# Altium footprint library Molex FFC - FPC Connectors (SMT).PcbLib: 638 footprints (part 22 of 40)
Each footprint in its own frame and in the unit in brackets; x right, y up, seen from the top. Pads: shape width x height; smd on the part's side, far side on the other; paste and mask are expansions set on the pad; w line width, h text height; cw(c..) or ccw(c..) is an arc to the next point about the centre after c.
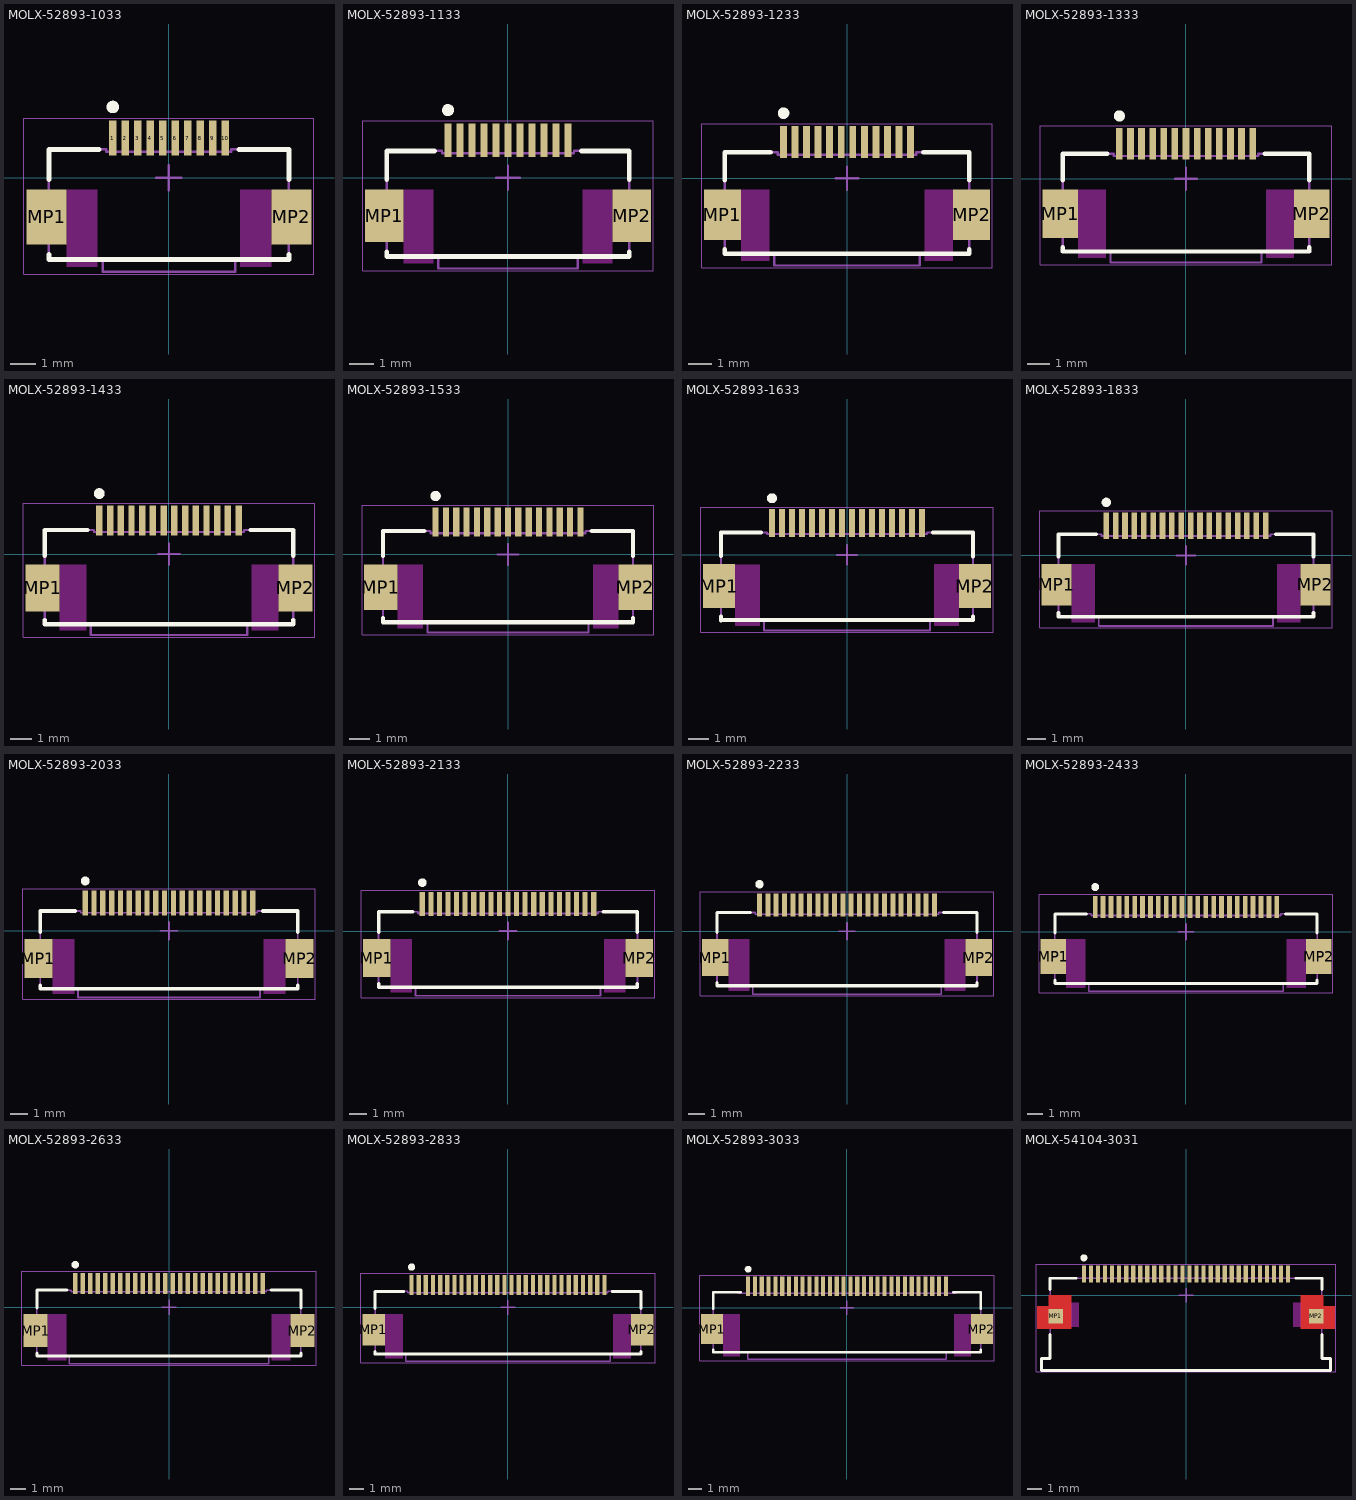
[diagram p21: the footprints below, top view; thin cyan lines are the x and y axes]

## MOLX-52893-1033 [mm] "FPC Connector, 10-Leads, Right Angle, Pitch 0.5 mm, Mated Height 2.0 mm, SMT"
height 2.082
pads (12):
  rect 0.3x1.4 smd: 1(-2.25,1.575) 2(-1.75,1.575) 3(-1.25,1.575) 4(-0.75,1.575) 5(-0.25,1.575) 6(0.25,1.575) 7(0.75,1.575) 8(1.25,1.575) 9(1.75,1.575) 10(2.25,1.575)
  rect 1.6x2.2 smd: MP1(-4.9,-1.575) MP2(4.9,-1.575)
Top Overlay:
  circle w0.25: c-2.25,2.825 r0.125
  lines w0.2: -4.8,-3.075 -4.8,-3.275 4.8,-3.275 4.8,-3.075 ; -4.8,-0.075 -4.8,1.125 -2.8,1.125 ; 2.8,1.125 4.8,1.125 4.8,-0.075
Keep-Out Layer:
  rectangle: 2.85,-3.575 4.1,-0.475
  rectangle: -4.1,-3.575 -2.85,-0.475
Mechanical 13:
  lines w0.1: -4.8,-3.275 -4.8,1.125 -2.5,1.125 -2.5,1.025 2.5,1.025 2.5,1.125 4.8,1.125 4.8,-3.275 2.65,-3.275 2.65,-3.762 -2.65,-3.762 -2.65,-3.275 -4.8,-3.275
Mechanical 15:
  lines w0.05: -5.8,-3.862 5.8,-3.862 5.8,2.375 -5.8,2.375 -5.8,-3.862
  lines w0.1: -0.5,0 0.5,0 ; 0,-0.5 0,0.5
3D body: height 0.25, standoff 0, extent -5.2,-3.775 5.2,1.725

## MOLX-52893-1133 [mm] "FPC Connector, 11-Leads, Right Angle, Pitch 0.5 mm, Mated Height 2.0 mm, SMT"
height 2.082
pads (13):
  rect 0.3x1.4 smd: 1(-2.5,1.575) 2(-2,1.575) 3(-1.5,1.575) 4(-1,1.575) 5(-0.5,1.575) 6(0,1.575) 7(0.5,1.575) 8(1,1.575) 9(1.5,1.575) 10(2,1.575) 11(2.5,1.575)
  rect 1.6x2.2 smd: MP1(-5.15,-1.575) MP2(5.15,-1.575)
Top Overlay:
  circle w0.25: c-2.5,2.825 r0.125
  lines w0.2: -5.05,-3.075 -5.05,-3.275 5.05,-3.275 5.05,-3.075 ; -5.05,-0.075 -5.05,1.125 -3.05,1.125 ; 3.05,1.125 5.05,1.125 5.05,-0.075
Keep-Out Layer:
  rectangle: -4.35,-3.575 -3.1,-0.475
  rectangle: 3.1,-3.575 4.35,-0.475
Mechanical 13:
  lines w0.1: 2.897,-3.775 -2.9,-3.775 -2.9,-3.275 -5.05,-3.275 -5.05,1.125 -2.75,1.125 -2.75,1.025 2.75,1.025 2.75,1.125 5.05,1.125 5.05,-3.275 2.9,-3.275 2.9,-3.775
Mechanical 15:
  lines w0.05: -6.05,-3.875 6.05,-3.875 6.05,2.375 -6.05,2.375 -6.05,-3.875
  lines w0.1: -0.5,0 0.5,0 ; 0,-0.5 0,0.5
3D body: height 0.25, standoff 0, extent -5.45,-3.775 5.45,1.725

## MOLX-52893-1233 [mm] "FPC Connector, 12-Leads, Right Angle, Pitch 0.5 mm, Mated Height 2.0 mm, SMT"
height 2.082
pads (14):
  rect 0.3x1.4 smd: 1(-2.75,1.575) 2(-2.25,1.575) 3(-1.75,1.575) 4(-1.25,1.575) 5(-0.75,1.575) 6(-0.25,1.575) 7(0.25,1.575) 8(0.75,1.575) 9(1.25,1.575) 10(1.75,1.575) 11(2.25,1.575) 12(2.75,1.575)
  rect 1.6x2.2 smd: MP1(-5.4,-1.575) MP2(5.4,-1.575)
Top Overlay:
  circle w0.25: c-2.75,2.825 r0.125
  lines w0.2: -5.3,-3.075 -5.3,-3.275 5.3,-3.275 5.3,-3.075 ; -5.3,-0.075 -5.3,1.125 -3.3,1.125 ; 3.3,1.125 5.3,1.125 ; 5.3,-0.075 5.3,1.125 ; 5.3,1.125 5.3,1.125
Keep-Out Layer:
  rectangle: 3.35,-3.575 4.6,-0.475
  rectangle: -4.6,-3.575 -3.35,-0.475
Mechanical 13:
  lines w0.1: -5.3,-3.275 -5.3,1.125 -3,1.125 -3,1.025 3,1.025 3,1.125 5.3,1.125 5.3,-3.275 3.15,-3.275 3.15,-3.775 -3.15,-3.775 -3.15,-3.275 -5.3,-3.275
Mechanical 15:
  lines w0.05: -6.3,-3.875 -6.3,2.375 6.3,2.375 6.3,-3.875 -6.3,-3.875
  lines w0.1: -0.5,0 0.5,0 ; 0,-0.5 0,0.5
3D body: height 0.25, standoff 0, extent -5.7,-3.775 5.7,1.725

## MOLX-52893-1333 [mm] "FPC Connector, 13-Leads, Right Angle, Pitch 0.5 mm, Mated Height 2.0 mm, SMT"
height 2.082
pads (15):
  rect 0.3x1.4 smd: 1(-3,1.575) 2(-2.5,1.575) 3(-2,1.575) 4(-1.5,1.575) 5(-1,1.575) 6(-0.5,1.575) 7(0,1.575) 8(0.5,1.575) 9(1,1.575) 10(1.5,1.575) 11(2,1.575) 12(2.5,1.575) 13(3,1.575)
  rect 1.6x2.2 smd: MP1(-5.65,-1.575) MP2(5.65,-1.575)
Top Overlay:
  circle w0.25: c-3,2.825 r0.125
  lines w0.2: -5.55,-3.075 -5.55,-3.275 5.55,-3.275 5.55,-3.075 ; -5.55,-0.075 -5.55,1.125 -3.55,1.125 ; 3.55,1.125 5.55,1.125 5.55,-0.075
Keep-Out Layer:
  rectangle: -4.85,-3.575 -3.6,-0.475
  rectangle: 3.6,-3.575 4.85,-0.475
Mechanical 13:
  lines w0.1: -5.55,-3.275 -5.55,1.125 -3.25,1.125 -3.25,1.025 3.25,1.025 3.25,1.125 5.55,1.125 5.55,-3.275 3.4,-3.275 3.4,-3.775 -3.4,-3.775 -3.4,-3.275 -5.55,-3.275
Mechanical 15:
  lines w0.05: -6.55,-3.875 -6.55,2.375 6.55,2.375 6.55,-3.875 -6.55,-3.875
  lines w0.1: -0.5,0 0.5,0 ; 0,-0.5 0,0.5
3D body: height 0.25, standoff 0, extent -5.95,-3.775 5.95,1.725

## MOLX-52893-1433 [mm] "FPC Connector, 14-Leads, Right Angle, Pitch 0.5 mm, Mated Height 2.0 mm, SMT"
height 2.082
pads (16):
  rect 0.3x1.4 smd: 1(-3.25,1.575) 2(-2.75,1.575) 3(-2.25,1.575) 4(-1.75,1.575) 5(-1.25,1.575) 6(-0.75,1.575) 7(-0.25,1.575) 8(0.25,1.575) 9(0.75,1.575) 10(1.25,1.575) 11(1.75,1.575) 12(2.25,1.575) 13(2.75,1.575) 14(3.25,1.575)
  rect 1.6x2.2 smd: MP1(-5.9,-1.575) MP2(5.9,-1.575)
Top Overlay:
  circle w0.25: c-3.25,2.825 r0.125
  lines w0.2: -5.8,-3.075 -5.8,-3.275 5.8,-3.275 5.8,-3.075 ; -5.8,-0.075 -5.8,1.125 -3.8,1.125 ; 3.8,1.125 5.8,1.125 5.8,-0.075
Keep-Out Layer:
  rectangle: -5.1,-3.575 -3.85,-0.475
  rectangle: 3.85,-3.575 5.1,-0.475
Mechanical 13:
  lines w0.1: -3.5,1.025 3.5,1.025 3.5,1.125 5.8,1.125 5.8,-3.275 3.65,-3.275 3.65,-3.775 -3.65,-3.775 -3.65,-3.275 -5.8,-3.275 -5.8,1.125 -3.5,1.125 -3.5,1.025 ; -3.5,1.025 -3.5,1.025
Mechanical 15:
  lines w0.05: -6.8,-3.875 -6.8,2.375 6.8,2.375 6.8,-3.875 -6.8,-3.875
  lines w0.1: -0.5,0 0.5,0 ; 0,-0.5 0,0.5
3D body: height 0.25, standoff 0, extent -6.2,-3.775 6.2,1.725

## MOLX-52893-1533 [mm] "FPC Connector, 15-Leads, Right Angle, Pitch 0.5 mm, Mated Height 2.0 mm, SMT"
height 2.082
pads (17):
  rect 0.3x1.4 smd: 1(-3.5,1.575) 2(-3,1.575) 3(-2.5,1.575) 4(-2,1.575) 5(-1.5,1.575) 6(-1,1.575) 7(-0.5,1.575) 8(0,1.575) 9(0.5,1.575) 10(1,1.575) 11(1.5,1.575) 12(2,1.575) 13(2.5,1.575) 14(3,1.575) 15(3.5,1.575)
  rect 1.6x2.2 smd: MP1(-6.15,-1.575) MP2(6.15,-1.575)
Top Overlay:
  circle w0.25: c-3.5,2.825 r0.125
  lines w0.2: -6.05,-3.075 -6.05,-3.275 6.05,-3.275 6.05,-3.075 ; -6.05,-0.075 -6.05,1.125 -4.05,1.125 ; 4.05,1.125 6.05,1.125 6.05,-0.075
Keep-Out Layer:
  rectangle: -5.35,-3.575 -4.1,-0.475
  rectangle: 4.1,-3.575 5.35,-0.475
Mechanical 13:
  lines w0.1: -6.05,-3.275 -3.9,-3.275 -3.9,-3.775 3.9,-3.775 3.9,-3.275 6.05,-3.275 6.05,1.125 3.75,1.125 3.75,1.025 -3.75,1.025 -3.75,1.125 -6.05,1.125 -6.05,-3.275
Mechanical 15:
  lines w0.05: -7.05,-3.875 -7.05,2.375 7.05,2.375 7.05,-3.875 -7.05,-3.875
  lines w0.1: -0.5,0 0.5,0 ; 0,-0.5 0,0.5
3D body: height 0.25, standoff 0, extent -6.45,-3.775 6.45,1.725

## MOLX-52893-1633 [mm] "FPC Connector, 16-Leads, Right Angle, Pitch 0.5 mm, Mated Height 2.0 mm, SMT"
height 2.082
pads (18):
  rect 0.3x1.4 smd: 1(-3.75,1.575) 2(-3.25,1.575) 3(-2.75,1.575) 4(-2.25,1.575) 5(-1.75,1.575) 6(-1.25,1.575) 7(-0.75,1.575) 8(-0.25,1.575) 9(0.25,1.575) 10(0.75,1.575) 11(1.25,1.575) 12(1.75,1.575) 13(2.25,1.575) 14(2.75,1.575) 15(3.25,1.575) 16(3.75,1.575)
  rect 1.6x2.2 smd: MP1(-6.4,-1.575) MP2(6.4,-1.575)
Top Overlay:
  circle w0.25: c-3.75,2.825 r0.125
  lines w0.2: -6.3,-3.075 -6.3,-3.275 6.3,-3.275 ; -6.3,-0.075 -6.3,1.125 -4.3,1.125 ; 4.3,1.125 6.3,1.125 6.3,-0.075 ; 6.3,-3.275 6.3,-3.075
Keep-Out Layer:
  rectangle: 4.35,-3.575 5.6,-0.475
  rectangle: -5.6,-3.575 -4.35,-0.475
Mechanical 13:
  lines w0.1: -6.3,-3.275 -4.15,-3.275 -4.15,-3.775 4.15,-3.775 4.15,-3.275 6.3,-3.275 6.3,1.125 4,1.125 4,1.025 -4,1.025 -4,1.125 -6.3,1.125 -6.3,-3.275
Mechanical 15:
  lines w0.05: -7.3,-3.875 7.3,-3.875 7.3,2.375 -7.3,2.375 -7.3,-3.875
  lines w0.1: -0.5,0 0.5,0 ; 0,-0.5 0,0.5
3D body: height 0.25, standoff 0, extent -6.7,-3.775 6.7,1.725

## MOLX-52893-1833 [mm] "FPC Connector, 18-Leads, Right Angle, Pitch 0.5 mm, Mated Height 2.0 mm, SMT"
height 2.082
pads (20):
  rect 0.3x1.4 smd: 1(-4.25,1.575) 2(-3.75,1.575) 3(-3.25,1.575) 4(-2.75,1.575) 5(-2.25,1.575) 6(-1.75,1.575) 7(-1.25,1.575) 8(-0.75,1.575) 9(-0.25,1.575) 10(0.25,1.575) 11(0.75,1.575) 12(1.25,1.575) 13(1.75,1.575) 14(2.25,1.575) 15(2.75,1.575) 16(3.25,1.575) 17(3.75,1.575) 18(4.25,1.575)
  rect 1.6x2.2 smd: MP1(-6.9,-1.575) MP2(6.9,-1.575)
Top Overlay:
  circle w0.25: c-4.25,2.825 r0.125
  lines w0.2: -6.8,-3.075 -6.8,-3.275 6.8,-3.275 6.8,-3.075 ; -6.8,-0.075 -6.8,1.125 -4.8,1.125 ; 4.8,1.125 6.8,1.125 6.8,-0.075
Keep-Out Layer:
  rectangle: 4.85,-3.575 6.1,-0.475
  rectangle: -6.1,-3.575 -4.85,-0.475
Mechanical 13:
  lines w0.1: -6.8,-3.275 -4.65,-3.275 -4.65,-3.775 4.65,-3.775 4.65,-3.275 6.8,-3.275 6.8,1.125 4.5,1.125 4.5,1.025 -4.5,1.025 -4.5,1.125 -6.8,1.125 -6.8,-3.275
Mechanical 15:
  lines w0.05: -7.8,-3.875 7.8,-3.875 7.8,2.375 -7.8,2.375 -7.8,-3.875
  lines w0.1: -0.5,0 0.5,0 ; 0,-0.5 0,0.5
3D body: height 0.25, standoff 0, extent -7.2,-3.775 7.2,1.725

## MOLX-52893-2033 [mm] "FPC Connector, 20-Leads, Right Angle, Pitch 0.5 mm, Mated Height 2.0 mm, SMT"
height 2.082
pads (22):
  rect 0.3x1.4 smd: 1(-4.75,1.575) 2(-4.25,1.575) 3(-3.75,1.575) 4(-3.25,1.575) 5(-2.75,1.575) 6(-2.25,1.575) 7(-1.75,1.575) 8(-1.25,1.575) 9(-0.75,1.575) 10(-0.25,1.575) 11(0.25,1.575) 12(0.75,1.575) 13(1.25,1.575) 14(1.75,1.575) 15(2.25,1.575) 16(2.75,1.575) 17(3.25,1.575) 18(3.75,1.575) 19(4.25,1.575) 20(4.75,1.575)
  rect 1.6x2.2 smd: MP1(-7.4,-1.575) MP2(7.4,-1.575)
Top Overlay:
  circle w0.25: c-4.75,2.825 r0.125
  lines w0.2: -7.3,-3.075 -7.3,-3.275 7.3,-3.275 7.3,-3.075 ; -7.3,-0.075 -7.3,1.125 -5.3,1.125 ; 5.3,1.125 7.3,1.125 7.3,-0.075
Keep-Out Layer:
  rectangle: 5.35,-3.575 6.6,-0.475
  rectangle: -6.6,-3.575 -5.35,-0.475
Mechanical 13:
  lines w0.1: -7.3,-3.275 -5.15,-3.275 -5.15,-3.775 5.15,-3.775 5.15,-3.275 7.3,-3.275 7.3,1.125 5,1.125 5,1.025 -5,1.025 -5,1.125 -7.3,1.125 -7.3,-3.275
Mechanical 15:
  lines w0.05: -8.3,-3.875 8.3,-3.875 8.3,2.375 -8.3,2.375 -8.3,-3.875
  lines w0.1: -0.5,0 0.5,0 ; 0,-0.5 0,0.5
3D body: height 0.25, standoff 0, extent -7.7,-3.775 7.7,1.725

## MOLX-52893-2133 [mm] "FPC Connector, 21-Leads, Right Angle, Pitch 0.5 mm, Mated Height 2.0 mm, SMT"
height 2.082
pads (23):
  rect 0.3x1.4 smd: 1(-5,1.575) 2(-4.5,1.575) 3(-4,1.575) 4(-3.5,1.575) 5(-3,1.575) 6(-2.5,1.575) 7(-2,1.575) 8(-1.5,1.575) 9(-1,1.575) 10(-0.5,1.575) 11(0,1.575) 12(0.5,1.575) 13(1,1.575) 14(1.5,1.575) 15(2,1.575) 16(2.5,1.575) 17(3,1.575) 18(3.5,1.575) 19(4,1.575) 20(4.5,1.575) 21(5,1.575)
  rect 1.6x2.2 smd: MP1(-7.65,-1.575) MP2(7.65,-1.575)
Top Overlay:
  circle w0.25: c-5,2.825 r0.125
  lines w0.2: -7.55,-3.075 -7.55,-3.275 7.55,-3.275 7.55,-3.075 ; -7.55,-0.075 -7.55,1.125 -5.55,1.125 ; 5.55,1.125 7.55,1.125 7.55,-0.075
Keep-Out Layer:
  rectangle: 5.6,-3.575 6.85,-0.475
  rectangle: -6.85,-3.575 -5.6,-0.475
Mechanical 13:
  lines w0.1: -7.55,-3.275 -5.4,-3.275 -5.4,-3.775 5.4,-3.775 5.4,-3.275 7.55,-3.275 7.55,1.125 5.25,1.125 5.25,1.025 -5.25,1.025 -5.25,1.125 -7.55,1.125 -7.55,-3.275
Mechanical 15:
  lines w0.05: -8.55,-3.875 8.55,-3.875 8.55,2.375 -8.55,2.375 -8.55,-3.875
  lines w0.1: -0.5,0 0.5,0 ; 0,-0.5 0,0.5
3D body: height 0.25, standoff 0, extent -7.95,-3.775 7.95,1.725

## MOLX-52893-2233 [mm] "FPC Connector, 22-Leads, Right Angle, Pitch 0.5 mm, Mated Height 2.0 mm, SMT"
height 2.082
pads (24):
  rect 0.3x1.4 smd: 1(-5.25,1.575) 2(-4.75,1.575) 3(-4.25,1.575) 4(-3.75,1.575) 5(-3.25,1.575) 6(-2.75,1.575) 7(-2.25,1.575) 8(-1.75,1.575) 9(-1.25,1.575) 10(-0.75,1.575) 11(-0.25,1.575) 12(0.25,1.575) 13(0.75,1.575) 14(1.25,1.575) 15(1.75,1.575) 16(2.25,1.575) 17(2.75,1.575) 18(3.25,1.575) 19(3.75,1.575) 20(4.25,1.575) 21(4.75,1.575) 22(5.25,1.575)
  rect 1.6x2.2 smd: MP1(-7.9,-1.575) MP2(7.9,-1.575)
Top Overlay:
  circle w0.25: c-5.25,2.825 r0.125
  lines w0.2: -7.8,-3.075 -7.8,-3.275 7.8,-3.275 7.8,-3.075 ; -7.8,-0.075 -7.8,1.125 -5.8,1.125 ; 5.8,1.125 7.8,1.125 7.8,-0.075
Keep-Out Layer:
  rectangle: -7.1,-3.575 -5.85,-0.475
  rectangle: 5.85,-3.575 7.1,-0.475
Mechanical 13:
  lines w0.1: -7.8,-3.275 -5.65,-3.275 -5.65,-3.775 5.65,-3.775 5.65,-3.275 7.8,-3.275 7.8,1.125 5.5,1.125 5.5,1.025 -5.5,1.025 -5.5,1.125 -7.8,1.125 -7.8,-3.275
Mechanical 15:
  lines w0.05: -8.8,-3.875 -8.8,2.375 8.8,2.375 8.8,-3.875 -8.8,-3.875
  lines w0.1: -0.5,0 0.5,0 ; 0,-0.5 0,0.5
3D body: height 0.25, standoff 0, extent -8.2,-3.775 8.2,1.725

## MOLX-52893-2433 [mm] "FPC Connector, 24-Leads, Right Angle, Pitch 0.5 mm, Mated Height 2.0 mm, SMT"
height 2.082
pads (26):
  rect 0.3x1.4 smd: 1(-5.75,1.575) 2(-5.25,1.575) 3(-4.75,1.575) 4(-4.25,1.575) 5(-3.75,1.575) 6(-3.25,1.575) 7(-2.75,1.575) 8(-2.25,1.575) 9(-1.75,1.575) 10(-1.25,1.575) 11(-0.75,1.575) 12(-0.25,1.575) 13(0.25,1.575) 14(0.75,1.575) 15(1.25,1.575) 16(1.75,1.575) 17(2.25,1.575) 18(2.75,1.575) 19(3.25,1.575) 20(3.75,1.575) 21(4.25,1.575) 22(4.75,1.575) 23(5.25,1.575) 24(5.75,1.575)
  rect 1.6x2.2 smd: MP1(-8.4,-1.575) MP2(8.4,-1.575)
Top Overlay:
  circle w0.25: c-5.75,2.825 r0.125
  lines w0.2: -8.3,-3.075 -8.3,-3.275 8.3,-3.275 8.3,-3.075 ; -8.3,-0.075 -8.3,1.125 -6.3,1.125 ; 6.3,1.125 8.3,1.125 8.3,-0.075
Keep-Out Layer:
  rectangle: -7.6,-3.575 -6.35,-0.475
  rectangle: 6.35,-3.575 7.6,-0.475
Mechanical 13:
  lines w0.1: -6.15,-3.775 -6.15,-3.275 -8.3,-3.275 -8.3,1.125 -6,1.125 -6,1.025 6,1.025 6,1.125 8.3,1.125 8.3,-3.275 6.15,-3.275 6.15,-3.775 -6.15,-3.775
Mechanical 15:
  lines w0.05: -9.3,-3.875 -9.3,2.375 9.3,2.375 9.3,-3.875 -9.3,-3.875
  lines w0.1: -0.5,0 0.5,0 ; 0,-0.5 0,0.5
3D body: height 0.25, standoff 0, extent -8.7,-3.775 8.7,1.725

## MOLX-52893-2633 [mm] "FPC Connector, 26-Leads, Right Angle, Pitch 0.5 mm, Mated Height 2.0 mm, SMT"
height 2.082
pads (28):
  rect 0.3x1.4 smd: 1(-6.25,1.575) 2(-5.75,1.575) 3(-5.25,1.575) 4(-4.75,1.575) 5(-4.25,1.575) 6(-3.75,1.575) 7(-3.25,1.575) 8(-2.75,1.575) 9(-2.25,1.575) 10(-1.75,1.575) 11(-1.25,1.575) 12(-0.75,1.575) 13(-0.25,1.575) 14(0.25,1.575) 15(0.75,1.575) 16(1.25,1.575) 17(1.75,1.575) 18(2.25,1.575) 19(2.75,1.575) 20(3.25,1.575) 21(3.75,1.575) 22(4.25,1.575) 23(4.75,1.575) 24(5.25,1.575) 25(5.75,1.575) 26(6.25,1.575)
  rect 1.6x2.2 smd: MP1(-8.9,-1.575) MP2(8.9,-1.575)
Top Overlay:
  circle w0.25: c-6.25,2.825 r0.125
  lines w0.2: -8.8,-3.075 -8.8,-3.275 8.8,-3.275 8.8,-3.075 ; -8.8,-0.075 -8.8,1.125 -6.8,1.125 ; 6.8,1.125 8.8,1.125 8.8,-0.075
Keep-Out Layer:
  rectangle: -8.1,-3.575 -6.85,-0.475
  rectangle: 6.85,-3.575 8.1,-0.475
Mechanical 13:
  lines w0.1: -8.8,-3.275 -6.65,-3.275 -6.65,-3.775 6.65,-3.775 6.65,-3.275 8.8,-3.275 8.8,1.125 6.5,1.125 6.5,1.025 -6.5,1.025 -6.5,1.125 -8.8,1.125 -8.8,-3.275
Mechanical 15:
  lines w0.05: -9.8,-3.875 -9.8,2.375 9.8,2.375 9.8,-3.875 -9.8,-3.875
  lines w0.1: -0.5,0 0.5,0 ; 0,-0.5 0,0.5
3D body: height 0.25, standoff 0, extent -9.2,-3.775 9.2,1.725

## MOLX-52893-2833 [mm] "FPC Connector, 28-Leads, Right Angle, Pitch 0.5 mm, Mated Height 2.0 mm, SMT"
height 2.082
pads (30):
  rect 0.3x1.4 smd: 1(-6.75,1.575) 2(-6.25,1.575) 3(-5.75,1.575) 4(-5.25,1.575) 5(-4.75,1.575) 6(-4.25,1.575) 7(-3.75,1.575) 8(-3.25,1.575) 9(-2.75,1.575) 10(-2.25,1.575) 11(-1.75,1.575) 12(-1.25,1.575) 13(-0.75,1.575) 14(-0.25,1.575) 15(0.25,1.575) 16(0.75,1.575) 17(1.25,1.575) 18(1.75,1.575) 19(2.25,1.575) 20(2.75,1.575) 21(3.25,1.575) 22(3.75,1.575) 23(4.25,1.575) 24(4.75,1.575) 25(5.25,1.575) 26(5.75,1.575) 27(6.25,1.575) 28(6.75,1.575)
  rect 1.6x2.2 smd: MP1(-9.4,-1.575) MP2(9.4,-1.575)
Top Overlay:
  circle w0.25: c-6.75,2.825 r0.125
  lines w0.2: -9.3,-3.075 -9.3,-3.275 9.3,-3.275 9.3,-3.075 ; -9.3,-0.075 -9.3,1.125 -7.3,1.125 ; 7.3,1.125 9.3,1.125 9.3,-0.075
Keep-Out Layer:
  rectangle: -8.6,-3.575 -7.35,-0.475
  rectangle: 7.35,-3.575 8.6,-0.475
Mechanical 13:
  lines w0.1: -9.3,-3.275 -7.15,-3.275 -7.15,-3.775 7.15,-3.775 7.15,-3.275 9.3,-3.275 9.3,1.125 7,1.125 7,1.025 -7,1.025 -7,1.125 -9.3,1.125 -9.3,-3.275
Mechanical 15:
  lines w0.05: -10.3,-3.875 -10.3,2.375 10.3,2.375 10.3,-3.875 -10.3,-3.875
  lines w0.1: -0.5,0 0.5,0 ; 0,-0.5 0,0.5
3D body: height 0.25, standoff 0, extent -9.7,-3.775 9.7,1.725

## MOLX-52893-3033 [mm] "FPC Connector, 30-Leads, Right Angle, Pitch 0.5 mm, Mated Height 2.0 mm, SMT"
height 2.052
pads (32):
  rect 0.3x1.4 smd: 1(-7.25,1.575) 2(-6.75,1.575) 3(-6.25,1.575) 4(-5.75,1.575) 5(-5.25,1.575) 6(-4.75,1.575) 7(-4.25,1.575) 8(-3.75,1.575) 9(-3.25,1.575) 10(-2.75,1.575) 11(-2.25,1.575) 12(-1.75,1.575) 13(-1.25,1.575) 14(-0.75,1.575) 15(-0.25,1.575) 16(0.25,1.575) 17(0.75,1.575) 18(1.25,1.575) 19(1.75,1.575) 20(2.25,1.575) 21(2.75,1.575) 22(3.25,1.575) 23(3.75,1.575) 24(4.25,1.575) 25(4.75,1.575) 26(5.25,1.575) 27(5.75,1.575) 28(6.25,1.575) 29(6.75,1.575) 30(7.25,1.575)
  rect 1.6x2.2 smd: MP1(-9.9,-1.575) MP2(9.9,-1.575)
Top Overlay:
  circle w0.25: c-7.25,2.825 r0.125
  lines w0.2: -9.8,-3.075 -9.8,-3.275 9.8,-3.275 9.8,-3.075 ; -9.8,-0.075 -9.8,1.125 -7.8,1.125 ; 7.8,1.125 9.8,1.125 9.8,-0.075
Keep-Out Layer:
  rectangle: 7.85,-3.575 9.1,-0.475
  rectangle: -9.1,-3.575 -7.85,-0.475
Mechanical 13:
  lines w0.1: -9.8,-3.275 -7.285,-3.275 -7.285,-3.775 7.285,-3.775 7.285,-3.275 9.8,-3.275 9.8,1.125 8,1.125 8,1.075 -8,1.075 -8,1.125 -9.8,1.125 -9.8,-3.275
Mechanical 15:
  lines w0.05: -10.8,-3.875 10.8,-3.875 10.8,2.375 -10.8,2.375 -10.8,-3.875
  lines w0.1: -0.5,0 0.5,0 ; 0,-0.5 0,0.5
3D body: height 0.25, standoff 0, extent -10.2,-3.775 10.2,1.725

## MOLX-54104-3031 [mm] "FPC Connector, 30-Leads, Right Angle, Pitch 0.5 mm, Mated Height 2.0 mm, SMT"
height 2.062
pads (32):
  rect 0.3x1.2 smd: 1(-7.25,1.5) 2(-6.75,1.5) 3(-6.25,1.5) 4(-5.75,1.5) 5(-5.25,1.5) 6(-4.75,1.5) 7(-4.25,1.5) 8(-3.75,1.5) 9(-3.25,1.5) 10(-2.75,1.5) 11(-2.25,1.5) 12(-1.75,1.5) 13(-1.25,1.5) 14(-0.75,1.5) 15(-0.25,1.5) 16(0.25,1.5) 17(0.75,1.5) 18(1.25,1.5) 19(1.75,1.5) 20(2.25,1.5) 21(2.75,1.5) 22(3.25,1.5) 23(3.75,1.5) 24(4.25,1.5) 25(4.75,1.5) 26(5.25,1.5) 27(5.75,1.5) 28(6.25,1.5) 29(6.75,1.5) 30(7.25,1.5)
  rect 1x1 smd: MP1(-9.25,-1.5) MP2(9.25,-1.5)
Top Layer:
  region: 8.15,0 9.75,0 9.75,-0.8 10.55,-0.8 10.55,-2.4 8.15,-2.4
  region: -8.15,0 -9.75,0 -9.75,-0.8 -10.55,-0.8 -10.55,-2.4 -8.15,-2.4
Top Overlay:
  circle w0.25: c-7.25,2.65 r0.125
  lines w0.2: -9.65,-2.8 -9.65,-4.5 -10.25,-4.5 -10.25,-5.35 10.25,-5.35 10.25,-4.5 9.65,-4.5 9.65,-2.8 ; -9.65,0.4 -9.65,1.2 -7.8,1.2 ; 7.8,1.2 9.65,1.2 9.65,0.4
Keep-Out Layer:
  region: 8.15,-0.55 7.6,-0.55 7.6,-2.25 8.15,-2.25
  region: -7.6,-0.55 -8.15,-0.55 -8.15,-2.25 -7.6,-2.25
Mechanical 13:
  lines w0.1: -10.25,-5.35 -10.25,-4.5 -9.65,-4.5 -9.65,1.2 9.65,1.2 9.65,-4.5 10.25,-4.5 10.25,-5.35 -10.25,-5.35
Mechanical 15:
  lines w0.05: -10.65,-5.45 10.65,-5.45 10.65,2.2 -10.65,2.2 -10.65,-5.45
  lines w0.1: -0.5,0 0.5,0 ; 0,-0.5 0,0.5
3D body: height 0.25, standoff 0, extent -10.25,-5.35 10.25,1.8